# Altium schematic symbol library jlcpcb_2025_04_capacitors_extended_0402.schlib: 3594 symbols (part 3 of 20) (continued)
## 0402N4R3C500CT
designator C?  Capacitance: 4.3pF  (hidden comment: *)
Capacitor, Ceramic (MLCC), 4.3pF, 50V, NP0, SMD 0402; Manufacturer: Walsin Tech Corp; Manufacturer Part Number: 0402N4R3C500CT; Package Size: 0402; JLCPCB Basic Part: No; JLCPCB Part Number: C295987; Supplier 1: LCSC; Category: Capacitors - MLCC; Supplier Part Number 1: C295987; Voltage Rating: 50V; Temperature Coefficient: NP0; RoHS: Yes; ComponentLink1Description: Datasheet; ComponentLink1URL: https://wmsc.lcsc.com/wmsc/upload/file/pdf/v2/lcsc/2304140030_Walsin-Tech-Corp-0402N4R3C500CT_C295987.pdf; ComponentLink2Description: JLCPCB Part URL; ComponentLink2URL: https://jlcpcb.com/partdetail/C295987; ComponentLink3Description: LCSC Part URL; ComponentLink3URL: https://lcsc.com/product-detail/Multilayer-Ceramic-Capacitors-MLCC---SMD-SMT_Walsin-Tech-Corp-Walsin-Tech-Corp-0402N4R3C500CT_C295987.html
footprint CAP-0402 (0402 (1005M) Capacitor)
pins: 1, 2

## 0402N4R7B500CT
designator C?  Capacitance: 4.7pF  (hidden comment: *)
Capacitor, Ceramic (MLCC), 4.7pF, 50V, NP0, SMD 0402; Manufacturer: Walsin Tech Corp; Manufacturer Part Number: 0402N4R7B500CT; Package Size: 0402; JLCPCB Basic Part: No; JLCPCB Part Number: C295988; Supplier 1: LCSC; Category: Capacitors - MLCC; Supplier Part Number 1: C295988; Voltage Rating: 50V; Temperature Coefficient: NP0; RoHS: Yes; ComponentLink1Description: Datasheet; ComponentLink1URL: https://wmsc.lcsc.com/wmsc/upload/file/pdf/v2/lcsc/2304140030_Walsin-Tech-Corp-0402N4R7B500CT_C295988.pdf; ComponentLink2Description: JLCPCB Part URL; ComponentLink2URL: https://jlcpcb.com/partdetail/C295988; ComponentLink3Description: LCSC Part URL; ComponentLink3URL: https://lcsc.com/product-detail/Multilayer-Ceramic-Capacitors-MLCC---SMD-SMT_Walsin-Tech-Corp-Walsin-Tech-Corp-0402N4R7B500CT_C295988.html
footprint CAP-0402 (0402 (1005M) Capacitor)
pins: 1, 2

## 0402N4R7D500CT
designator C?  Capacitance: 4.7pF  (hidden comment: *)
Capacitor, Ceramic (MLCC), 4.7pF, 50V, NP0, SMD 0402; Manufacturer: Walsin Tech Corp; Manufacturer Part Number: 0402N4R7D500CT; Package Size: 0402; JLCPCB Basic Part: No; JLCPCB Part Number: C295990; Supplier 1: LCSC; Category: Capacitors - MLCC; Supplier Part Number 1: C295990; Voltage Rating: 50V; Temperature Coefficient: NP0; RoHS: Yes; ComponentLink1Description: Datasheet; ComponentLink1URL: https://wmsc.lcsc.com/wmsc/upload/file/pdf/v2/lcsc/2304140030_Walsin-Tech-Corp-0402N4R7D500CT_C295990.pdf; ComponentLink2Description: JLCPCB Part URL; ComponentLink2URL: https://jlcpcb.com/partdetail/C295990; ComponentLink3Description: LCSC Part URL; ComponentLink3URL: https://lcsc.com/product-detail/Multilayer-Ceramic-Capacitors-MLCC---SMD-SMT_Walsin-Tech-Corp-Walsin-Tech-Corp-0402N4R7D500CT_C295990.html
footprint CAP-0402 (0402 (1005M) Capacitor)
pins: 1, 2

## 0402N5R0B500CT
designator C?  Capacitance: 5pF  (hidden comment: *)
Capacitor, Ceramic (MLCC), 5pF, 50V, NP0, SMD 0402; Manufacturer: Walsin Tech Corp; Manufacturer Part Number: 0402N5R0B500CT; Package Size: 0402; JLCPCB Basic Part: No; JLCPCB Part Number: C458868; Supplier 1: LCSC; Category: Capacitors - MLCC; Supplier Part Number 1: C458868; Voltage Rating: 50V; Temperature Coefficient: NP0; RoHS: Yes; ComponentLink1Description: Datasheet; ComponentLink1URL: https://wmsc.lcsc.com/wmsc/upload/file/pdf/v2/lcsc/2304140030_Walsin-Tech-Corp-0402N5R0B500CT_C458868.pdf; ComponentLink2Description: JLCPCB Part URL; ComponentLink2URL: https://jlcpcb.com/partdetail/C458868; ComponentLink3Description: LCSC Part URL; ComponentLink3URL: https://lcsc.com/product-detail/Multilayer-Ceramic-Capacitors-MLCC---SMD-SMT_Walsin-Tech-Corp-Walsin-Tech-Corp-0402N5R0B500CT_C458868.html
footprint CAP-0402 (0402 (1005M) Capacitor)
pins: 1, 2

## 0402N5R0C500CT
designator C?  Capacitance: 5pF  (hidden comment: *)
Capacitor, Ceramic (MLCC), 5pF, 50V, NP0, SMD 0402; Manufacturer: Walsin Tech Corp; Manufacturer Part Number: 0402N5R0C500CT; Package Size: 0402; JLCPCB Basic Part: No; JLCPCB Part Number: C314281; Supplier 1: LCSC; Category: Capacitors - MLCC; Supplier Part Number 1: C314281; Voltage Rating: 50V; Temperature Coefficient: NP0; RoHS: Yes; ComponentLink1Description: Datasheet; ComponentLink1URL: https://wmsc.lcsc.com/wmsc/upload/file/pdf/v2/lcsc/2304140030_Walsin-Tech-Corp-0402N5R0C500CT_C314281.pdf; ComponentLink2Description: JLCPCB Part URL; ComponentLink2URL: https://jlcpcb.com/partdetail/C314281; ComponentLink3Description: LCSC Part URL; ComponentLink3URL: https://lcsc.com/product-detail/Multilayer-Ceramic-Capacitors-MLCC---SMD-SMT_Walsin-Tech-Corp-Walsin-Tech-Corp-0402N5R0C500CT_C314281.html
footprint CAP-0402 (0402 (1005M) Capacitor)
pins: 1, 2

## 0402N5R0D500CT
designator C?  Capacitance: 5pF  (hidden comment: *)
Capacitor, Ceramic (MLCC), 5pF, 50V, NP0, SMD 0402; Manufacturer: Walsin Tech Corp; Manufacturer Part Number: 0402N5R0D500CT; Package Size: 0402; JLCPCB Basic Part: No; JLCPCB Part Number: C295993; Supplier 1: LCSC; Category: Capacitors - MLCC; Supplier Part Number 1: C295993; Voltage Rating: 50V; Temperature Coefficient: NP0; RoHS: Yes; ComponentLink1Description: Datasheet; ComponentLink1URL: https://wmsc.lcsc.com/wmsc/upload/file/pdf/v2/lcsc/2304140030_Walsin-Tech-Corp-0402N5R0D500CT_C295993.pdf; ComponentLink2Description: JLCPCB Part URL; ComponentLink2URL: https://jlcpcb.com/partdetail/C295993; ComponentLink3Description: LCSC Part URL; ComponentLink3URL: https://lcsc.com/product-detail/Multilayer-Ceramic-Capacitors-MLCC---SMD-SMT_Walsin-Tech-Corp-Walsin-Tech-Corp-0402N5R0D500CT_C295993.html
footprint CAP-0402 (0402 (1005M) Capacitor)
pins: 1, 2

## 0402N5R6C500CT
designator C?  Capacitance: 5.6pF  (hidden comment: *)
Capacitor, Ceramic (MLCC), 5.6pF, 50V, NP0, SMD 0402; Manufacturer: Walsin Tech Corp; Manufacturer Part Number: 0402N5R6C500CT; Package Size: 0402; JLCPCB Basic Part: No; JLCPCB Part Number: C387981; Supplier 1: LCSC; Category: Capacitors - MLCC; Supplier Part Number 1: C387981; Voltage Rating: 50V; Temperature Coefficient: NP0; RoHS: Yes; ComponentLink1Description: Datasheet; ComponentLink1URL: https://wmsc.lcsc.com/wmsc/upload/file/pdf/v2/lcsc/2304140030_Walsin-Tech-Corp-0402N5R6C500CT_C387981.pdf; ComponentLink2Description: JLCPCB Part URL; ComponentLink2URL: https://jlcpcb.com/partdetail/C387981; ComponentLink3Description: LCSC Part URL; ComponentLink3URL: https://lcsc.com/product-detail/Multilayer-Ceramic-Capacitors-MLCC---SMD-SMT_Walsin-Tech-Corp-Walsin-Tech-Corp-0402N5R6C500CT_C387981.html
footprint CAP-0402 (0402 (1005M) Capacitor)
pins: 1, 2

## 0402N5R6D500CT
designator C?  Capacitance: 5.6pF  (hidden comment: *)
Capacitor, Ceramic (MLCC), 5.6pF, 50V, NP0, SMD 0402; Manufacturer: Walsin Tech Corp; Manufacturer Part Number: 0402N5R6D500CT; Package Size: 0402; JLCPCB Basic Part: No; JLCPCB Part Number: C525498; Supplier 1: LCSC; Category: Capacitors - MLCC; Supplier Part Number 1: C525498; Voltage Rating: 50V; Temperature Coefficient: NP0; RoHS: Yes; ComponentLink1Description: Datasheet; ComponentLink1URL: https://wmsc.lcsc.com/wmsc/upload/file/pdf/v2/lcsc/2304140030_Walsin-Tech-Corp-0402N5R6D500CT_C525498.pdf; ComponentLink2Description: JLCPCB Part URL; ComponentLink2URL: https://jlcpcb.com/partdetail/C525498; ComponentLink3Description: LCSC Part URL; ComponentLink3URL: https://lcsc.com/product-detail/Multilayer-Ceramic-Capacitors-MLCC---SMD-SMT_Walsin-Tech-Corp-Walsin-Tech-Corp-0402N5R6D500CT_C525498.html
footprint CAP-0402 (0402 (1005M) Capacitor)
pins: 1, 2

## 0402N6R0C500CT
designator C?  Capacitance: 6pF  (hidden comment: *)
Capacitor, Ceramic (MLCC), 6pF, 50V, NP0, SMD 0402; Manufacturer: Walsin Tech Corp; Manufacturer Part Number: 0402N6R0C500CT; Package Size: 0402; JLCPCB Basic Part: No; JLCPCB Part Number: C555384; Supplier 1: LCSC; Category: Capacitors - MLCC; Supplier Part Number 1: C555384; Voltage Rating: 50V; Temperature Coefficient: NP0; RoHS: Yes; ComponentLink1Description: Datasheet; ComponentLink1URL: https://wmsc.lcsc.com/wmsc/upload/file/pdf/v2/lcsc/2304140030_Walsin-Tech-Corp-0402N6R0C500CT_C555384.pdf; ComponentLink2Description: JLCPCB Part URL; ComponentLink2URL: https://jlcpcb.com/partdetail/C555384; ComponentLink3Description: LCSC Part URL; ComponentLink3URL: https://lcsc.com/product-detail/Multilayer-Ceramic-Capacitors-MLCC---SMD-SMT_Walsin-Tech-Corp-Walsin-Tech-Corp-0402N6R0C500CT_C555384.html
footprint CAP-0402 (0402 (1005M) Capacitor)
pins: 1, 2

## 0402N6R0D500CT
designator C?  Capacitance: 6pF  (hidden comment: *)
Capacitor, Ceramic (MLCC), 6pF, 50V, NP0, SMD 0402; Manufacturer: Walsin Tech Corp; Manufacturer Part Number: 0402N6R0D500CT; Package Size: 0402; JLCPCB Basic Part: No; JLCPCB Part Number: C295997; Supplier 1: LCSC; Category: Capacitors - MLCC; Supplier Part Number 1: C295997; Voltage Rating: 50V; Temperature Coefficient: NP0; RoHS: Yes; ComponentLink1Description: Datasheet; ComponentLink1URL: https://wmsc.lcsc.com/wmsc/upload/file/pdf/v2/lcsc/2304140030_Walsin-Tech-Corp-0402N6R0D500CT_C295997.pdf; ComponentLink2Description: JLCPCB Part URL; ComponentLink2URL: https://jlcpcb.com/partdetail/C295997; ComponentLink3Description: LCSC Part URL; ComponentLink3URL: https://lcsc.com/product-detail/Multilayer-Ceramic-Capacitors-MLCC---SMD-SMT_Walsin-Tech-Corp-Walsin-Tech-Corp-0402N6R0D500CT_C295997.html
footprint CAP-0402 (0402 (1005M) Capacitor)
pins: 1, 2

## 0402N6R2D500CT
designator C?  Capacitance: 6.2pF  (hidden comment: *)
Capacitor, Ceramic (MLCC), 6.2pF, 50V, NP0, SMD 0402; Manufacturer: Walsin Tech Corp; Manufacturer Part Number: 0402N6R2D500CT; Package Size: 0402; JLCPCB Basic Part: No; JLCPCB Part Number: C295998; Supplier 1: LCSC; Category: Capacitors - MLCC; Supplier Part Number 1: C295998; Voltage Rating: 50V; Temperature Coefficient: NP0; RoHS: Yes; ComponentLink1Description: Datasheet; ComponentLink1URL: https://wmsc.lcsc.com/wmsc/upload/file/pdf/v2/lcsc/2304140030_Walsin-Tech-Corp-0402N6R2D500CT_C295998.pdf; ComponentLink2Description: JLCPCB Part URL; ComponentLink2URL: https://jlcpcb.com/partdetail/C295998; ComponentLink3Description: LCSC Part URL; ComponentLink3URL: https://lcsc.com/product-detail/Multilayer-Ceramic-Capacitors-MLCC---SMD-SMT_Walsin-Tech-Corp-Walsin-Tech-Corp-0402N6R2D500CT_C295998.html
footprint CAP-0402 (0402 (1005M) Capacitor)
pins: 1, 2

## 0402N6R8B500CT
designator C?  Capacitance: 6.8pF  (hidden comment: *)
Capacitor, Ceramic (MLCC), 6.8pF, 50V, NP0, SMD 0402; Manufacturer: Walsin Tech Corp; Manufacturer Part Number: 0402N6R8B500CT; Package Size: 0402; JLCPCB Basic Part: No; JLCPCB Part Number: C295999; Supplier 1: LCSC; Category: Capacitors - MLCC; Supplier Part Number 1: C295999; Voltage Rating: 50V; Temperature Coefficient: NP0; RoHS: Yes; ComponentLink1Description: Datasheet; ComponentLink1URL: https://wmsc.lcsc.com/wmsc/upload/file/pdf/v2/lcsc/2304140030_Walsin-Tech-Corp-0402N6R8B500CT_C295999.pdf; ComponentLink2Description: JLCPCB Part URL; ComponentLink2URL: https://jlcpcb.com/partdetail/C295999; ComponentLink3Description: LCSC Part URL; ComponentLink3URL: https://lcsc.com/product-detail/Multilayer-Ceramic-Capacitors-MLCC---SMD-SMT_Walsin-Tech-Corp-Walsin-Tech-Corp-0402N6R8B500CT_C295999.html
footprint CAP-0402 (0402 (1005M) Capacitor)
pins: 1, 2

## 0402N6R8C500CT
designator C?  Capacitance: 6.8pF  (hidden comment: *)
Capacitor, Ceramic (MLCC), 6.8pF, 50V, NP0, SMD 0402; Manufacturer: Walsin Tech Corp; Manufacturer Part Number: 0402N6R8C500CT; Package Size: 0402; JLCPCB Basic Part: No; JLCPCB Part Number: C296000; Supplier 1: LCSC; Category: Capacitors - MLCC; Supplier Part Number 1: C296000; Voltage Rating: 50V; Temperature Coefficient: NP0; RoHS: Yes; ComponentLink1Description: Datasheet; ComponentLink1URL: https://wmsc.lcsc.com/wmsc/upload/file/pdf/v2/lcsc/2304140030_Walsin-Tech-Corp-0402N6R8C500CT_C296000.pdf; ComponentLink2Description: JLCPCB Part URL; ComponentLink2URL: https://jlcpcb.com/partdetail/C296000; ComponentLink3Description: LCSC Part URL; ComponentLink3URL: https://lcsc.com/product-detail/Multilayer-Ceramic-Capacitors-MLCC---SMD-SMT_Walsin-Tech-Corp-Walsin-Tech-Corp-0402N6R8C500CT_C296000.html
footprint CAP-0402 (0402 (1005M) Capacitor)
pins: 1, 2

## 0402N7R0B500CT
designator C?  Capacitance: 7pF  (hidden comment: *)
Capacitor, Ceramic (MLCC), 7pF, 50V, NP0, SMD 0402; Manufacturer: Walsin Tech Corp; Manufacturer Part Number: 0402N7R0B500CT; Package Size: 0402; JLCPCB Basic Part: No; JLCPCB Part Number: C366878; Supplier 1: LCSC; Category: Capacitors - MLCC; Supplier Part Number 1: C366878; Voltage Rating: 50V; Temperature Coefficient: NP0; RoHS: Yes; ComponentLink1Description: Datasheet; ComponentLink1URL: https://wmsc.lcsc.com/wmsc/upload/file/pdf/v2/lcsc/2304140030_Walsin-Tech-Corp-0402N7R0B500CT_C366878.pdf; ComponentLink2Description: JLCPCB Part URL; ComponentLink2URL: https://jlcpcb.com/partdetail/C366878; ComponentLink3Description: LCSC Part URL; ComponentLink3URL: https://lcsc.com/product-detail/Multilayer-Ceramic-Capacitors-MLCC---SMD-SMT_Walsin-Tech-Corp-Walsin-Tech-Corp-0402N7R0B500CT_C366878.html
footprint CAP-0402 (0402 (1005M) Capacitor)
pins: 1, 2

## 0402N7R0C500CT
designator C?  Capacitance: 7pF  (hidden comment: *)
Capacitor, Ceramic (MLCC), 7pF, 50V, NP0, SMD 0402; Manufacturer: Walsin Tech Corp; Manufacturer Part Number: 0402N7R0C500CT; Package Size: 0402; JLCPCB Basic Part: No; JLCPCB Part Number: C296001; Supplier 1: LCSC; Category: Capacitors - MLCC; Supplier Part Number 1: C296001; Voltage Rating: 50V; Temperature Coefficient: NP0; RoHS: Yes; ComponentLink1Description: Datasheet; ComponentLink1URL: https://wmsc.lcsc.com/wmsc/upload/file/pdf/v2/lcsc/2304140030_Walsin-Tech-Corp-0402N7R0C500CT_C296001.pdf; ComponentLink2Description: JLCPCB Part URL; ComponentLink2URL: https://jlcpcb.com/partdetail/C296001; ComponentLink3Description: LCSC Part URL; ComponentLink3URL: https://lcsc.com/product-detail/Multilayer-Ceramic-Capacitors-MLCC---SMD-SMT_Walsin-Tech-Corp-Walsin-Tech-Corp-0402N7R0C500CT_C296001.html
footprint CAP-0402 (0402 (1005M) Capacitor)
pins: 1, 2

## 0402N7R0C500CT-C
designator C?  Capacitance: 7pF  (hidden comment: *)
Capacitor, Ceramic (MLCC), 7pF, 50V, NP0, SMD 0402; Manufacturer: Walsin Tech Corp; Manufacturer Part Number: 0402N7R0C500CT-C; Package Size: 0402; JLCPCB Basic Part: No; JLCPCB Part Number: C2991471; Supplier 1: LCSC; Category: Capacitors - MLCC; Supplier Part Number 1: C2991471; Voltage Rating: 50V; Temperature Coefficient: NP0; RoHS: Yes; ComponentLink1Description: Datasheet; ComponentLink1URL: https://wmsc.lcsc.com/wmsc/upload/file/pdf/v2/lcsc/2204131745_Walsin-Tech-Corp-0402N7R0C500CT-C_C2991471.pdf; ComponentLink2Description: JLCPCB Part URL; ComponentLink2URL: https://jlcpcb.com/partdetail/C2991471; ComponentLink3Description: LCSC Part URL; ComponentLink3URL: https://lcsc.com/product-detail/Multilayer-Ceramic-Capacitors-MLCC---SMD-SMT_Walsin-Tech-Corp-Walsin-Tech-Corp-0402N7R0C500CT-C_C2991471.html
footprint CAP-0402 (0402 (1005M) Capacitor)
pins: 1, 2

## 0402N7R0D500CT
designator C?  Capacitance: 7pF  (hidden comment: *)
Capacitor, Ceramic (MLCC), 7pF, 50V, NP0, SMD 0402; Manufacturer: Walsin Tech Corp; Manufacturer Part Number: 0402N7R0D500CT; Package Size: 0402; JLCPCB Basic Part: No; JLCPCB Part Number: C314299; Supplier 1: LCSC; Category: Capacitors - MLCC; Supplier Part Number 1: C314299; Voltage Rating: 50V; Temperature Coefficient: NP0; RoHS: Yes; ComponentLink1Description: Datasheet; ComponentLink1URL: https://wmsc.lcsc.com/wmsc/upload/file/pdf/v2/lcsc/2304140030_Walsin-Tech-Corp-0402N7R0D500CT_C314299.pdf; ComponentLink2Description: JLCPCB Part URL; ComponentLink2URL: https://jlcpcb.com/partdetail/C314299; ComponentLink3Description: LCSC Part URL; ComponentLink3URL: https://lcsc.com/product-detail/Multilayer-Ceramic-Capacitors-MLCC---SMD-SMT_Walsin-Tech-Corp-Walsin-Tech-Corp-0402N7R0D500CT_C314299.html
footprint CAP-0402 (0402 (1005M) Capacitor)
pins: 1, 2

## 0402N7R5C500CT
designator C?  Capacitance: 7.5pF  (hidden comment: *)
Capacitor, Ceramic (MLCC), 7.5pF, 50V, NP0, SMD 0402; Manufacturer: Walsin Tech Corp; Manufacturer Part Number: 0402N7R5C500CT; Package Size: 0402; JLCPCB Basic Part: No; JLCPCB Part Number: C296002; Supplier 1: LCSC; Category: Capacitors - MLCC; Supplier Part Number 1: C296002; Voltage Rating: 50V; Temperature Coefficient: NP0; RoHS: Yes; ComponentLink1Description: Datasheet; ComponentLink1URL: https://wmsc.lcsc.com/wmsc/upload/file/pdf/v2/lcsc/2304140030_Walsin-Tech-Corp-0402N7R5C500CT_C296002.pdf; ComponentLink2Description: JLCPCB Part URL; ComponentLink2URL: https://jlcpcb.com/partdetail/C296002; ComponentLink3Description: LCSC Part URL; ComponentLink3URL: https://lcsc.com/product-detail/Multilayer-Ceramic-Capacitors-MLCC---SMD-SMT_Walsin-Tech-Corp-Walsin-Tech-Corp-0402N7R5C500CT_C296002.html
footprint CAP-0402 (0402 (1005M) Capacitor)
pins: 1, 2

## 0402N7R5D500CT
designator C?  Capacitance: 7.5pF  (hidden comment: *)
Capacitor, Ceramic (MLCC), 7.5pF, 50V, NP0, SMD 0402; Manufacturer: Walsin Tech Corp; Manufacturer Part Number: 0402N7R5D500CT; Package Size: 0402; JLCPCB Basic Part: No; JLCPCB Part Number: C388119; Supplier 1: LCSC; Category: Capacitors - MLCC; Supplier Part Number 1: C388119; Voltage Rating: 50V; Temperature Coefficient: NP0; RoHS: Yes; ComponentLink1Description: Datasheet; ComponentLink1URL: https://wmsc.lcsc.com/wmsc/upload/file/pdf/v2/lcsc/2304140030_Walsin-Tech-Corp-0402N7R5D500CT_C388119.pdf; ComponentLink2Description: JLCPCB Part URL; ComponentLink2URL: https://jlcpcb.com/partdetail/C388119; ComponentLink3Description: LCSC Part URL; ComponentLink3URL: https://lcsc.com/product-detail/Multilayer-Ceramic-Capacitors-MLCC---SMD-SMT_Walsin-Tech-Corp-Walsin-Tech-Corp-0402N7R5D500CT_C388119.html
footprint CAP-0402 (0402 (1005M) Capacitor)
pins: 1, 2

## 0402N8R0B500CT
designator C?  Capacitance: 8pF  (hidden comment: *)
Capacitor, Ceramic (MLCC), 8pF, 50V, NP0, SMD 0402; Manufacturer: Walsin Tech Corp; Manufacturer Part Number: 0402N8R0B500CT; Package Size: 0402; JLCPCB Basic Part: No; JLCPCB Part Number: C314292; Supplier 1: LCSC; Category: Capacitors - MLCC; Supplier Part Number 1: C314292; Voltage Rating: 50V; Temperature Coefficient: NP0; RoHS: Yes; ComponentLink1Description: Datasheet; ComponentLink1URL: https://wmsc.lcsc.com/wmsc/upload/file/pdf/v2/lcsc/2304140030_Walsin-Tech-Corp-0402N8R0B500CT_C314292.pdf; ComponentLink2Description: JLCPCB Part URL; ComponentLink2URL: https://jlcpcb.com/partdetail/C314292; ComponentLink3Description: LCSC Part URL; ComponentLink3URL: https://lcsc.com/product-detail/Multilayer-Ceramic-Capacitors-MLCC---SMD-SMT_Walsin-Tech-Corp-Walsin-Tech-Corp-0402N8R0B500CT_C314292.html
footprint CAP-0402 (0402 (1005M) Capacitor)
pins: 1, 2

## 0402N8R0C500CT
designator C?  Capacitance: 8pF  (hidden comment: *)
Capacitor, Ceramic (MLCC), 8pF, 50V, NP0, SMD 0402; Manufacturer: Walsin Tech Corp; Manufacturer Part Number: 0402N8R0C500CT; Package Size: 0402; JLCPCB Basic Part: No; JLCPCB Part Number: C296005; Supplier 1: LCSC; Category: Capacitors - MLCC; Supplier Part Number 1: C296005; Voltage Rating: 50V; Temperature Coefficient: NP0; RoHS: Yes; ComponentLink1Description: Datasheet; ComponentLink1URL: https://wmsc.lcsc.com/wmsc/upload/file/pdf/v2/lcsc/2304140030_Walsin-Tech-Corp-0402N8R0C500CT_C296005.pdf; ComponentLink2Description: JLCPCB Part URL; ComponentLink2URL: https://jlcpcb.com/partdetail/C296005; ComponentLink3Description: LCSC Part URL; ComponentLink3URL: https://lcsc.com/product-detail/Multilayer-Ceramic-Capacitors-MLCC---SMD-SMT_Walsin-Tech-Corp-Walsin-Tech-Corp-0402N8R0C500CT_C296005.html
footprint CAP-0402 (0402 (1005M) Capacitor)
pins: 1, 2

## 0402N8R0D500CT
designator C?  Capacitance: 8pF  (hidden comment: *)
Capacitor, Ceramic (MLCC), 8pF, 50V, NP0, SMD 0402; Manufacturer: Walsin Tech Corp; Manufacturer Part Number: 0402N8R0D500CT; Package Size: 0402; JLCPCB Basic Part: No; JLCPCB Part Number: C296006; Supplier 1: LCSC; Category: Capacitors - MLCC; Supplier Part Number 1: C296006; Voltage Rating: 50V; Temperature Coefficient: NP0; RoHS: Yes; ComponentLink1Description: Datasheet; ComponentLink1URL: https://wmsc.lcsc.com/wmsc/upload/file/pdf/v2/lcsc/2304140030_Walsin-Tech-Corp-0402N8R0D500CT_C296006.pdf; ComponentLink2Description: JLCPCB Part URL; ComponentLink2URL: https://jlcpcb.com/partdetail/C296006; ComponentLink3Description: LCSC Part URL; ComponentLink3URL: https://lcsc.com/product-detail/Multilayer-Ceramic-Capacitors-MLCC---SMD-SMT_Walsin-Tech-Corp-Walsin-Tech-Corp-0402N8R0D500CT_C296006.html
footprint CAP-0402 (0402 (1005M) Capacitor)
pins: 1, 2

## 0402N8R2B500CT
designator C?  Capacitance: 8.2pF  (hidden comment: *)
Capacitor, Ceramic (MLCC), 8.2pF, 50V, NP0, SMD 0402; Manufacturer: Walsin Tech Corp; Manufacturer Part Number: 0402N8R2B500CT; Package Size: 0402; JLCPCB Basic Part: No; JLCPCB Part Number: C301994; Supplier 1: LCSC; Category: Capacitors - MLCC; Supplier Part Number 1: C301994; Voltage Rating: 50V; Temperature Coefficient: NP0; RoHS: Yes; ComponentLink1Description: Datasheet; ComponentLink1URL: https://wmsc.lcsc.com/wmsc/upload/file/pdf/v2/lcsc/2304140030_Walsin-Tech-Corp-0402N8R2B500CT_C301994.pdf; ComponentLink2Description: JLCPCB Part URL; ComponentLink2URL: https://jlcpcb.com/partdetail/C301994; ComponentLink3Description: LCSC Part URL; ComponentLink3URL: https://lcsc.com/product-detail/Multilayer-Ceramic-Capacitors-MLCC---SMD-SMT_Walsin-Tech-Corp-Walsin-Tech-Corp-0402N8R2B500CT_C301994.html
footprint CAP-0402 (0402 (1005M) Capacitor)
pins: 1, 2

## 0402N8R2C500CT
designator C?  Capacitance: 8.2pF  (hidden comment: *)
Capacitor, Ceramic (MLCC), 8.2pF, 50V, NP0, SMD 0402; Manufacturer: Walsin Tech Corp; Manufacturer Part Number: 0402N8R2C500CT; Package Size: 0402; JLCPCB Basic Part: No; JLCPCB Part Number: C296007; Supplier 1: LCSC; Category: Capacitors - MLCC; Supplier Part Number 1: C296007; Voltage Rating: 50V; Temperature Coefficient: NP0; RoHS: Yes; ComponentLink1Description: Datasheet; ComponentLink1URL: https://wmsc.lcsc.com/wmsc/upload/file/pdf/v2/lcsc/2304140030_Walsin-Tech-Corp-0402N8R2C500CT_C296007.pdf; ComponentLink2Description: JLCPCB Part URL; ComponentLink2URL: https://jlcpcb.com/partdetail/C296007; ComponentLink3Description: LCSC Part URL; ComponentLink3URL: https://lcsc.com/product-detail/Multilayer-Ceramic-Capacitors-MLCC---SMD-SMT_Walsin-Tech-Corp-Walsin-Tech-Corp-0402N8R2C500CT_C296007.html
footprint CAP-0402 (0402 (1005M) Capacitor)
pins: 1, 2

## 0402N8R2C500CT-C
designator C?  Capacitance: 8.2pF  (hidden comment: *)
Capacitor, Ceramic (MLCC), 8.2pF, 50V, NP0, SMD 0402; Manufacturer: Walsin Tech Corp; Manufacturer Part Number: 0402N8R2C500CT-C; Package Size: 0402; JLCPCB Basic Part: No; JLCPCB Part Number: C2991485; Supplier 1: LCSC; Category: Capacitors - MLCC; Supplier Part Number 1: C2991485; Voltage Rating: 50V; Temperature Coefficient: NP0; RoHS: Yes; ComponentLink1Description: Datasheet; ComponentLink1URL: https://wmsc.lcsc.com/wmsc/upload/file/pdf/v2/lcsc/2204131745_Walsin-Tech-Corp-0402N8R2C500CT-C_C2991485.pdf; ComponentLink2Description: JLCPCB Part URL; ComponentLink2URL: https://jlcpcb.com/partdetail/C2991485; ComponentLink3Description: LCSC Part URL; ComponentLink3URL: https://lcsc.com/product-detail/Multilayer-Ceramic-Capacitors-MLCC---SMD-SMT_Walsin-Tech-Corp-Walsin-Tech-Corp-0402N8R2C500CT-C_C2991485.html
footprint CAP-0402 (0402 (1005M) Capacitor)
pins: 1, 2

## 0402N8R2D500CT
designator C?  Capacitance: 8.2pF  (hidden comment: *)
Capacitor, Ceramic (MLCC), 8.2pF, 50V, NP0, SMD 0402; Manufacturer: Walsin Tech Corp; Manufacturer Part Number: 0402N8R2D500CT; Package Size: 0402; JLCPCB Basic Part: No; JLCPCB Part Number: C301995; Supplier 1: LCSC; Category: Capacitors - MLCC; Supplier Part Number 1: C301995; Voltage Rating: 50V; Temperature Coefficient: NP0; RoHS: Yes; ComponentLink1Description: Datasheet; ComponentLink1URL: https://wmsc.lcsc.com/wmsc/upload/file/pdf/v2/lcsc/2304140030_Walsin-Tech-Corp-0402N8R2D500CT_C301995.pdf; ComponentLink2Description: JLCPCB Part URL; ComponentLink2URL: https://jlcpcb.com/partdetail/C301995; ComponentLink3Description: LCSC Part URL; ComponentLink3URL: https://lcsc.com/product-detail/Multilayer-Ceramic-Capacitors-MLCC---SMD-SMT_Walsin-Tech-Corp-Walsin-Tech-Corp-0402N8R2D500CT_C301995.html
footprint CAP-0402 (0402 (1005M) Capacitor)
pins: 1, 2

## 0402N9R0B500CT
designator C?  Capacitance: 9pF  (hidden comment: *)
Capacitor, Ceramic (MLCC), 9pF, 50V, NP0, SMD 0402; Manufacturer: Walsin Tech Corp; Manufacturer Part Number: 0402N9R0B500CT; Package Size: 0402; JLCPCB Basic Part: No; JLCPCB Part Number: C384797; Supplier 1: LCSC; Category: Capacitors - MLCC; Supplier Part Number 1: C384797; Voltage Rating: 50V; Temperature Coefficient: NP0; RoHS: Yes; ComponentLink1Description: Datasheet; ComponentLink1URL: https://wmsc.lcsc.com/wmsc/upload/file/pdf/v2/lcsc/2304140030_Walsin-Tech-Corp-0402N9R0B500CT_C384797.pdf; ComponentLink2Description: JLCPCB Part URL; ComponentLink2URL: https://jlcpcb.com/partdetail/C384797; ComponentLink3Description: LCSC Part URL; ComponentLink3URL: https://lcsc.com/product-detail/Multilayer-Ceramic-Capacitors-MLCC---SMD-SMT_Walsin-Tech-Corp-Walsin-Tech-Corp-0402N9R0B500CT_C384797.html
footprint CAP-0402 (0402 (1005M) Capacitor)
pins: 1, 2

## 0402N9R0C500CT
designator C?  Capacitance: 9pF  (hidden comment: *)
Capacitor, Ceramic (MLCC), 9pF, 50V, NP0, SMD 0402; Manufacturer: Walsin Tech Corp; Manufacturer Part Number: 0402N9R0C500CT; Package Size: 0402; JLCPCB Basic Part: No; JLCPCB Part Number: C296009; Supplier 1: LCSC; Category: Capacitors - MLCC; Supplier Part Number 1: C296009; Voltage Rating: 50V; Temperature Coefficient: NP0; RoHS: Yes; ComponentLink1Description: Datasheet; ComponentLink1URL: https://wmsc.lcsc.com/wmsc/upload/file/pdf/v2/lcsc/2304140030_Walsin-Tech-Corp-0402N9R0C500CT_C296009.pdf; ComponentLink2Description: JLCPCB Part URL; ComponentLink2URL: https://jlcpcb.com/partdetail/C296009; ComponentLink3Description: LCSC Part URL; ComponentLink3URL: https://lcsc.com/product-detail/Multilayer-Ceramic-Capacitors-MLCC---SMD-SMT_Walsin-Tech-Corp-Walsin-Tech-Corp-0402N9R0C500CT_C296009.html
footprint CAP-0402 (0402 (1005M) Capacitor)
pins: 1, 2

## 0402N9R0D500CT
designator C?  Capacitance: 9pF  (hidden comment: *)
Capacitor, Ceramic (MLCC), 9pF, 50V, NP0, SMD 0402; Manufacturer: Walsin Tech Corp; Manufacturer Part Number: 0402N9R0D500CT; Package Size: 0402; JLCPCB Basic Part: No; JLCPCB Part Number: C296010; Supplier 1: LCSC; Category: Capacitors - MLCC; Supplier Part Number 1: C296010; Voltage Rating: 50V; Temperature Coefficient: NP0; RoHS: Yes; ComponentLink1Description: Datasheet; ComponentLink1URL: https://wmsc.lcsc.com/wmsc/upload/file/pdf/v2/lcsc/2304140030_Walsin-Tech-Corp-0402N9R0D500CT_C296010.pdf; ComponentLink2Description: JLCPCB Part URL; ComponentLink2URL: https://jlcpcb.com/partdetail/C296010; ComponentLink3Description: LCSC Part URL; ComponentLink3URL: https://lcsc.com/product-detail/Multilayer-Ceramic-Capacitors-MLCC---SMD-SMT_Walsin-Tech-Corp-Walsin-Tech-Corp-0402N9R0D500CT_C296010.html
footprint CAP-0402 (0402 (1005M) Capacitor)
pins: 1, 2

## 0402N9R1C500CT
designator C?  Capacitance: 9.1pF  (hidden comment: *)
Capacitor, Ceramic (MLCC), 9.1pF, 50V, NP0, SMD 0402; Manufacturer: Walsin Tech Corp; Manufacturer Part Number: 0402N9R1C500CT; Package Size: 0402; JLCPCB Basic Part: No; JLCPCB Part Number: C2875524; Supplier 1: LCSC; Category: Capacitors - MLCC; Supplier Part Number 1: C2875524; Voltage Rating: 50V; Temperature Coefficient: NP0; RoHS: Yes; ComponentLink1Description: Datasheet; ComponentLink1URL: https://wmsc.lcsc.com/wmsc/upload/file/pdf/v2/lcsc/2108241230_Walsin-Tech-Corp-0402N9R1C500CT_C2875524.pdf; ComponentLink2Description: JLCPCB Part URL; ComponentLink2URL: https://jlcpcb.com/partdetail/C2875524; ComponentLink3Description: LCSC Part URL; ComponentLink3URL: https://lcsc.com/product-detail/Multilayer-Ceramic-Capacitors-MLCC---SMD-SMT_Walsin-Tech-Corp-Walsin-Tech-Corp-0402N9R1C500CT_C2875524.html
footprint CAP-0402 (0402 (1005M) Capacitor)
pins: 1, 2

## 0402N100C500CT
designator C?  Capacitance: 10pF  (hidden comment: *)
Capacitor, Ceramic (MLCC), 10pF, 50V, NP0, SMD 0402; Manufacturer: Walsin Tech Corp; Manufacturer Part Number: 0402N100C500CT; Package Size: 0402; JLCPCB Basic Part: No; JLCPCB Part Number: C387966; Supplier 1: LCSC; Category: Capacitors - MLCC; Supplier Part Number 1: C387966; Voltage Rating: 50V; Temperature Coefficient: NP0; RoHS: Yes; ComponentLink1Description: Datasheet; ComponentLink1URL: https://wmsc.lcsc.com/wmsc/upload/file/pdf/v2/lcsc/2304140030_Walsin-Tech-Corp-0402N100C500CT_C387966.pdf; ComponentLink2Description: JLCPCB Part URL; ComponentLink2URL: https://jlcpcb.com/partdetail/C387966; ComponentLink3Description: LCSC Part URL; ComponentLink3URL: https://lcsc.com/product-detail/Multilayer-Ceramic-Capacitors-MLCC---SMD-SMT_Walsin-Tech-Corp-Walsin-Tech-Corp-0402N100C500CT_C387966.html
footprint CAP-0402 (0402 (1005M) Capacitor)
pins: 1, 2

## 0402N100D500CT
designator C?  Capacitance: 10pF  (hidden comment: *)
Capacitor, Ceramic (MLCC), 10pF, 50V, NP0, SMD 0402; Manufacturer: Walsin Tech Corp; Manufacturer Part Number: 0402N100D500CT; Package Size: 0402; JLCPCB Basic Part: No; JLCPCB Part Number: C295953; Supplier 1: LCSC; Category: Capacitors - MLCC; Supplier Part Number 1: C295953; Voltage Rating: 50V; Temperature Coefficient: NP0; RoHS: Yes; ComponentLink1Description: Datasheet; ComponentLink1URL: https://wmsc.lcsc.com/wmsc/upload/file/pdf/v2/lcsc/2304140030_Walsin-Tech-Corp-0402N100D500CT_C295953.pdf; ComponentLink2Description: JLCPCB Part URL; ComponentLink2URL: https://jlcpcb.com/partdetail/C295953; ComponentLink3Description: LCSC Part URL; ComponentLink3URL: https://lcsc.com/product-detail/Multilayer-Ceramic-Capacitors-MLCC---SMD-SMT_Walsin-Tech-Corp-Walsin-Tech-Corp-0402N100D500CT_C295953.html
footprint CAP-0402 (0402 (1005M) Capacitor)
pins: 1, 2

## 0402N100F500CT
designator C?  Capacitance: 10pF  (hidden comment: *)
Capacitor, Ceramic (MLCC), 10pF, ±1%, 50V, NP0, ±1%, SMD 0402; Manufacturer: Walsin Tech Corp; Manufacturer Part Number: 0402N100F500CT; Package Size: 0402; JLCPCB Basic Part: No; JLCPCB Part Number: C237160; Supplier 1: LCSC; Category: Capacitors - MLCC; Supplier Part Number 1: C237160; Tolerance: ±1%; Voltage Rating: 50V; Temperature Coefficient: NP0; RoHS: Yes; ComponentLink1Description: Datasheet; ComponentLink1URL: https://wmsc.lcsc.com/wmsc/upload/file/pdf/v2/lcsc/2304140030_Walsin-Tech-Corp-0402N100F500CT_C237160.pdf; ComponentLink2Description: JLCPCB Part URL; ComponentLink2URL: https://jlcpcb.com/partdetail/C237160; ComponentLink3Description: LCSC Part URL; ComponentLink3URL: https://lcsc.com/product-detail/Multilayer-Ceramic-Capacitors-MLCC---SMD-SMT_Walsin-Tech-Corp-Walsin-Tech-Corp-0402N100F500CT_C237160.html
footprint CAP-0402 (0402 (1005M) Capacitor)
pins: 1, 2

## 0402N100G500CT
designator C?  Capacitance: 10pF  (hidden comment: *)
Capacitor, Ceramic (MLCC), 10pF, ±2%, 50V, NP0, ±2%, SMD 0402; Manufacturer: Walsin Tech Corp; Manufacturer Part Number: 0402N100G500CT; Package Size: 0402; JLCPCB Basic Part: No; JLCPCB Part Number: C338152; Supplier 1: LCSC; Category: Capacitors - MLCC; Supplier Part Number 1: C338152; Tolerance: ±2%; Voltage Rating: 50V; Temperature Coefficient: NP0; RoHS: Yes; ComponentLink1Description: Datasheet; ComponentLink1URL: https://wmsc.lcsc.com/wmsc/upload/file/pdf/v2/lcsc/2304140030_Walsin-Tech-Corp-0402N100G500CT_C338152.pdf; ComponentLink2Description: JLCPCB Part URL; ComponentLink2URL: https://jlcpcb.com/partdetail/C338152; ComponentLink3Description: LCSC Part URL; ComponentLink3URL: https://lcsc.com/product-detail/Multilayer-Ceramic-Capacitors-MLCC---SMD-SMT_Walsin-Tech-Corp-Walsin-Tech-Corp-0402N100G500CT_C338152.html
footprint CAP-0402 (0402 (1005M) Capacitor)
pins: 1, 2

## 0402N100J250CT
designator C?  Capacitance: 10pF  (hidden comment: *)
Capacitor, Ceramic (MLCC), 10pF, ±5%, 25V, NP0, ±5%, SMD 0402; Manufacturer: Walsin Tech Corp; Manufacturer Part Number: 0402N100J250CT; Package Size: 0402; JLCPCB Basic Part: No; JLCPCB Part Number: C424825; Supplier 1: LCSC; Category: Capacitors - MLCC; Supplier Part Number 1: C424825; Tolerance: ±5%; Voltage Rating: 25V; Temperature Coefficient: NP0; RoHS: Yes; ComponentLink1Description: Datasheet; ComponentLink1URL: https://wmsc.lcsc.com/wmsc/upload/file/pdf/v2/lcsc/2304140030_Walsin-Tech-Corp-0402N100J250CT_C424825.pdf; ComponentLink2Description: JLCPCB Part URL; ComponentLink2URL: https://jlcpcb.com/partdetail/C424825; ComponentLink3Description: LCSC Part URL; ComponentLink3URL: https://lcsc.com/product-detail/Multilayer-Ceramic-Capacitors-MLCC---SMD-SMT_Walsin-Tech-Corp-Walsin-Tech-Corp-0402N100J250CT_C424825.html
footprint CAP-0402 (0402 (1005M) Capacitor)
pins: 1, 2

## 0402N100J500CT
designator C?  Capacitance: 10pF  (hidden comment: *)
Capacitor, Ceramic (MLCC), 10pF, ±5%, 50V, NP0, ±5%, SMD 0402; Manufacturer: Walsin Tech Corp; Manufacturer Part Number: 0402N100J500CT; Package Size: 0402; JLCPCB Basic Part: No; JLCPCB Part Number: C301961; Supplier 1: LCSC; Category: Capacitors - MLCC; Supplier Part Number 1: C301961; Tolerance: ±5%; Voltage Rating: 50V; Temperature Coefficient: NP0; RoHS: Yes; ComponentLink1Description: Datasheet; ComponentLink1URL: https://wmsc.lcsc.com/wmsc/upload/file/pdf/v2/lcsc/2304140030_Walsin-Tech-Corp-0402N100J500CT_C301961.pdf; ComponentLink2Description: JLCPCB Part URL; ComponentLink2URL: https://jlcpcb.com/partdetail/C301961; ComponentLink3Description: LCSC Part URL; ComponentLink3URL: https://lcsc.com/product-detail/Multilayer-Ceramic-Capacitors-MLCC---SMD-SMT_Walsin-Tech-Corp-Walsin-Tech-Corp-0402N100J500CT_C301961.html
footprint CAP-0402 (0402 (1005M) Capacitor)
pins: 1, 2

## 0402N100K500CT
designator C?  Capacitance: 10pF  (hidden comment: *)
Capacitor, Ceramic (MLCC), 10pF, ±10%, 50V, NP0, ±10%, SMD 0402; Manufacturer: Walsin Tech Corp; Manufacturer Part Number: 0402N100K500CT; Package Size: 0402; JLCPCB Basic Part: No; JLCPCB Part Number: C295954; Supplier 1: LCSC; Category: Capacitors - MLCC; Supplier Part Number 1: C295954; Tolerance: ±10%; Voltage Rating: 50V; Temperature Coefficient: NP0; RoHS: Yes; ComponentLink1Description: Datasheet; ComponentLink1URL: https://wmsc.lcsc.com/wmsc/upload/file/pdf/v2/lcsc/2304140030_Walsin-Tech-Corp-0402N100K500CT_C295954.pdf; ComponentLink2Description: JLCPCB Part URL; ComponentLink2URL: https://jlcpcb.com/partdetail/C295954; ComponentLink3Description: LCSC Part URL; ComponentLink3URL: https://lcsc.com/product-detail/Multilayer-Ceramic-Capacitors-MLCC---SMD-SMT_Walsin-Tech-Corp-Walsin-Tech-Corp-0402N100K500CT_C295954.html
footprint CAP-0402 (0402 (1005M) Capacitor)
pins: 1, 2

## 0402N101F500CT
designator C?  Capacitance: 100pF  (hidden comment: *)
Capacitor, Ceramic (MLCC), 100pF, ±1%, 50V, NP0, ±1%, SMD 0402; Manufacturer: Walsin Tech Corp; Manufacturer Part Number: 0402N101F500CT; Package Size: 0402; JLCPCB Basic Part: No; JLCPCB Part Number: C295955; Supplier 1: LCSC; Category: Capacitors - MLCC; Supplier Part Number 1: C295955; Tolerance: ±1%; Voltage Rating: 50V; Temperature Coefficient: NP0; RoHS: Yes; ComponentLink1Description: Datasheet; ComponentLink1URL: https://wmsc.lcsc.com/wmsc/upload/file/pdf/v2/lcsc/2304140030_Walsin-Tech-Corp-0402N101F500CT_C295955.pdf; ComponentLink2Description: JLCPCB Part URL; ComponentLink2URL: https://jlcpcb.com/partdetail/C295955; ComponentLink3Description: LCSC Part URL; ComponentLink3URL: https://lcsc.com/product-detail/Multilayer-Ceramic-Capacitors-MLCC---SMD-SMT_Walsin-Tech-Corp-Walsin-Tech-Corp-0402N101F500CT_C295955.html
footprint CAP-0402 (0402 (1005M) Capacitor)
pins: 1, 2

## 0402N101G500CT
designator C?  Capacitance: 100pF  (hidden comment: *)
Capacitor, Ceramic (MLCC), 100pF, ±2%, 50V, NP0, ±2%, SMD 0402; Manufacturer: Walsin Tech Corp; Manufacturer Part Number: 0402N101G500CT; Package Size: 0402; JLCPCB Basic Part: No; JLCPCB Part Number: C387967; Supplier 1: LCSC; Category: Capacitors - MLCC; Supplier Part Number 1: C387967; Tolerance: ±2%; Voltage Rating: 50V; Temperature Coefficient: NP0; RoHS: Yes; ComponentLink1Description: Datasheet; ComponentLink1URL: https://wmsc.lcsc.com/wmsc/upload/file/pdf/v2/lcsc/2304140030_Walsin-Tech-Corp-0402N101G500CT_C387967.pdf; ComponentLink2Description: JLCPCB Part URL; ComponentLink2URL: https://jlcpcb.com/partdetail/C387967; ComponentLink3Description: LCSC Part URL; ComponentLink3URL: https://lcsc.com/product-detail/Multilayer-Ceramic-Capacitors-MLCC---SMD-SMT_Walsin-Tech-Corp-Walsin-Tech-Corp-0402N101G500CT_C387967.html
footprint CAP-0402 (0402 (1005M) Capacitor)
pins: 1, 2

## 0402N101J250CT
designator C?  Capacitance: 100pF  (hidden comment: *)
Capacitor, Ceramic (MLCC), 100pF, ±5%, 25V, NP0, ±5%, SMD 0402; Manufacturer: Walsin Tech Corp; Manufacturer Part Number: 0402N101J250CT; Package Size: 0402; JLCPCB Basic Part: No; JLCPCB Part Number: C387968; Supplier 1: LCSC; Category: Capacitors - MLCC; Supplier Part Number 1: C387968; Tolerance: ±5%; Voltage Rating: 25V; Temperature Coefficient: NP0; RoHS: Yes; ComponentLink1Description: Datasheet; ComponentLink1URL: https://wmsc.lcsc.com/wmsc/upload/file/pdf/v2/lcsc/2304140030_Walsin-Tech-Corp-0402N101J250CT_C387968.pdf; ComponentLink2Description: JLCPCB Part URL; ComponentLink2URL: https://jlcpcb.com/partdetail/C387968; ComponentLink3Description: LCSC Part URL; ComponentLink3URL: https://lcsc.com/product-detail/Multilayer-Ceramic-Capacitors-MLCC---SMD-SMT_Walsin-Tech-Corp-Walsin-Tech-Corp-0402N101J250CT_C387968.html
footprint CAP-0402 (0402 (1005M) Capacitor)
pins: 1, 2

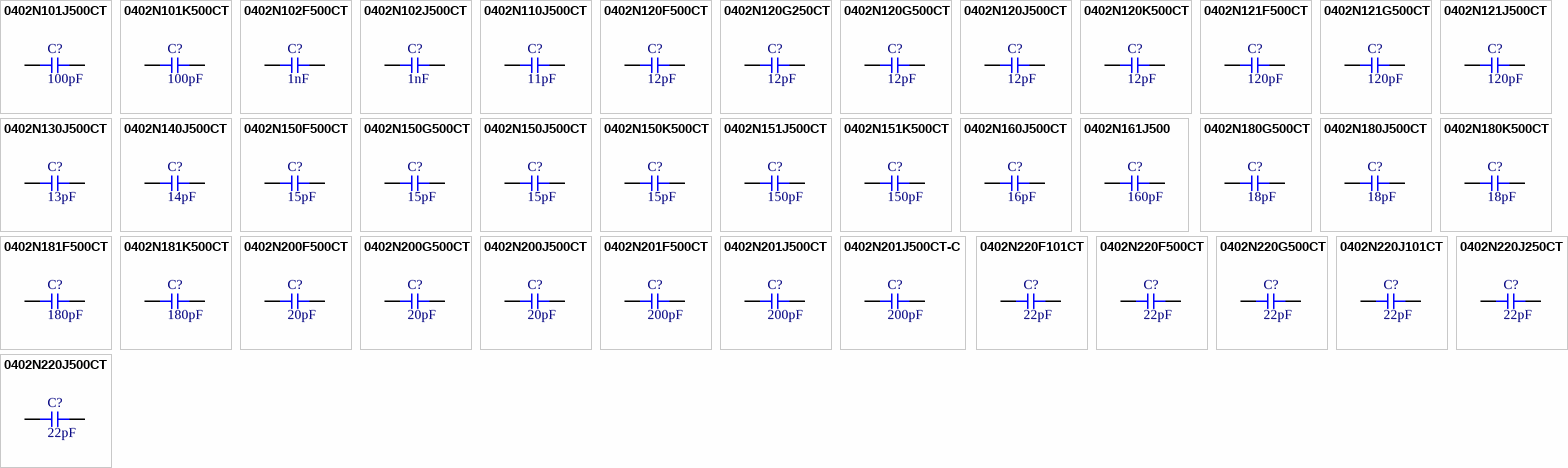
[diagram p11: symbols 0402N101J500CT to 0402N220J500CT]

## 0402N101J500CT
designator C?  Capacitance: 100pF  (hidden comment: *)
Capacitor, Ceramic (MLCC), 100pF, ±5%, 50V, NP0, ±5%, SMD 0402; Manufacturer: Walsin Tech Corp; Manufacturer Part Number: 0402N101J500CT; Package Size: 0402; JLCPCB Basic Part: No; JLCPCB Part Number: C301962; Supplier 1: LCSC; Category: Capacitors - MLCC; Supplier Part Number 1: C301962; Tolerance: ±5%; Voltage Rating: 50V; Temperature Coefficient: NP0; RoHS: Yes; ComponentLink1Description: Datasheet; ComponentLink1URL: https://wmsc.lcsc.com/wmsc/upload/file/pdf/v2/lcsc/2304140030_Walsin-Tech-Corp-0402N101J500CT_C301962.pdf; ComponentLink2Description: JLCPCB Part URL; ComponentLink2URL: https://jlcpcb.com/partdetail/C301962; ComponentLink3Description: LCSC Part URL; ComponentLink3URL: https://lcsc.com/product-detail/Multilayer-Ceramic-Capacitors-MLCC---SMD-SMT_Walsin-Tech-Corp-Walsin-Tech-Corp-0402N101J500CT_C301962.html
footprint CAP-0402 (0402 (1005M) Capacitor)
pins: 1, 2

## 0402N101K500CT
designator C?  Capacitance: 100pF  (hidden comment: *)
Capacitor, Ceramic (MLCC), 100pF, ±10%, 50V, NP0, ±10%, SMD 0402; Manufacturer: Walsin Tech Corp; Manufacturer Part Number: 0402N101K500CT; Package Size: 0402; JLCPCB Basic Part: No; JLCPCB Part Number: C295957; Supplier 1: LCSC; Category: Capacitors - MLCC; Supplier Part Number 1: C295957; Tolerance: ±10%; Voltage Rating: 50V; Temperature Coefficient: NP0; RoHS: Yes; ComponentLink1Description: Datasheet; ComponentLink1URL: https://wmsc.lcsc.com/wmsc/upload/file/pdf/v2/lcsc/2304140030_Walsin-Tech-Corp-0402N101K500CT_C295957.pdf; ComponentLink2Description: JLCPCB Part URL; ComponentLink2URL: https://jlcpcb.com/partdetail/C295957; ComponentLink3Description: LCSC Part URL; ComponentLink3URL: https://lcsc.com/product-detail/Multilayer-Ceramic-Capacitors-MLCC---SMD-SMT_Walsin-Tech-Corp-Walsin-Tech-Corp-0402N101K500CT_C295957.html
footprint CAP-0402 (0402 (1005M) Capacitor)
pins: 1, 2

## 0402N102F500CT
designator C?  Capacitance: 1nF  (hidden comment: *)
Capacitor, Ceramic (MLCC), 1nF, ±1%, 50V, C0G, ±1%, SMD 0402; Manufacturer: Walsin Tech Corp; Manufacturer Part Number: 0402N102F500CT; Package Size: 0402; JLCPCB Basic Part: No; JLCPCB Part Number: C3834952; Supplier 1: LCSC; Category: Capacitors - MLCC; Supplier Part Number 1: C3834952; Tolerance: ±1%; Voltage Rating: 50V; Temperature Coefficient: C0G; RoHS: Yes; ComponentLink1Description: Datasheet; ComponentLink1URL: https://wmsc.lcsc.com/wmsc/upload/file/pdf/v2/lcsc/2309201533_Walsin-Tech-Corp-0402N102F500CT_C3834952.pdf; ComponentLink2Description: JLCPCB Part URL; ComponentLink2URL: https://jlcpcb.com/partdetail/C3834952; ComponentLink3Description: LCSC Part URL; ComponentLink3URL: https://lcsc.com/product-detail/Multilayer-Ceramic-Capacitors-MLCC---SMD-SMT_Walsin-Tech-Corp-Walsin-Tech-Corp-0402N102F500CT_C3834952.html
footprint CAP-0402 (0402 (1005M) Capacitor)
pins: 1, 2

## 0402N102J500CT
designator C?  Capacitance: 1nF  (hidden comment: *)
Capacitor, Ceramic (MLCC), 1nF, ±5%, 50V, NP0, ±5%, SMD 0402; Manufacturer: Walsin Tech Corp; Manufacturer Part Number: 0402N102J500CT; Package Size: 0402; JLCPCB Basic Part: No; JLCPCB Part Number: C237166; Supplier 1: LCSC; Category: Capacitors - MLCC; Supplier Part Number 1: C237166; Tolerance: ±5%; Voltage Rating: 50V; Temperature Coefficient: NP0; RoHS: Yes; ComponentLink1Description: Datasheet; ComponentLink1URL: https://wmsc.lcsc.com/wmsc/upload/file/pdf/v2/lcsc/2304140030_Walsin-Tech-Corp-0402N102J500CT_C237166.pdf; ComponentLink2Description: JLCPCB Part URL; ComponentLink2URL: https://jlcpcb.com/partdetail/C237166; ComponentLink3Description: LCSC Part URL; ComponentLink3URL: https://lcsc.com/product-detail/Multilayer-Ceramic-Capacitors-MLCC---SMD-SMT_Walsin-Tech-Corp-Walsin-Tech-Corp-0402N102J500CT_C237166.html
footprint CAP-0402 (0402 (1005M) Capacitor)
pins: 1, 2

## 0402N110J500CT
designator C?  Capacitance: 11pF  (hidden comment: *)
Capacitor, Ceramic (MLCC), 11pF, ±5%, 50V, NP0, ±5%, SMD 0402; Manufacturer: Walsin Tech Corp; Manufacturer Part Number: 0402N110J500CT; Package Size: 0402; JLCPCB Basic Part: No; JLCPCB Part Number: C458855; Supplier 1: LCSC; Category: Capacitors - MLCC; Supplier Part Number 1: C458855; Tolerance: ±5%; Voltage Rating: 50V; Temperature Coefficient: NP0; RoHS: Yes; ComponentLink1Description: Datasheet; ComponentLink1URL: https://wmsc.lcsc.com/wmsc/upload/file/pdf/v2/lcsc/2304140030_Walsin-Tech-Corp-0402N110J500CT_C458855.pdf; ComponentLink2Description: JLCPCB Part URL; ComponentLink2URL: https://jlcpcb.com/partdetail/C458855; ComponentLink3Description: LCSC Part URL; ComponentLink3URL: https://lcsc.com/product-detail/Multilayer-Ceramic-Capacitors-MLCC---SMD-SMT_Walsin-Tech-Corp-Walsin-Tech-Corp-0402N110J500CT_C458855.html
footprint CAP-0402 (0402 (1005M) Capacitor)
pins: 1, 2

## 0402N120F500CT
designator C?  Capacitance: 12pF  (hidden comment: *)
Capacitor, Ceramic (MLCC), 12pF, ±1%, 50V, NP0, ±1%, SMD 0402; Manufacturer: Walsin Tech Corp; Manufacturer Part Number: 0402N120F500CT; Package Size: 0402; JLCPCB Basic Part: No; JLCPCB Part Number: C555399; Supplier 1: LCSC; Category: Capacitors - MLCC; Supplier Part Number 1: C555399; Tolerance: ±1%; Voltage Rating: 50V; Temperature Coefficient: NP0; RoHS: Yes; ComponentLink1Description: Datasheet; ComponentLink1URL: https://wmsc.lcsc.com/wmsc/upload/file/pdf/v2/lcsc/2304140030_Walsin-Tech-Corp-0402N120F500CT_C555399.pdf; ComponentLink2Description: JLCPCB Part URL; ComponentLink2URL: https://jlcpcb.com/partdetail/C555399; ComponentLink3Description: LCSC Part URL; ComponentLink3URL: https://lcsc.com/product-detail/Multilayer-Ceramic-Capacitors-MLCC---SMD-SMT_Walsin-Tech-Corp-Walsin-Tech-Corp-0402N120F500CT_C555399.html
footprint CAP-0402 (0402 (1005M) Capacitor)
pins: 1, 2

## 0402N120G250CT
designator C?  Capacitance: 12pF  (hidden comment: *)
Capacitor, Ceramic (MLCC), 12pF, ±2%, 25V, NP0, ±2%, SMD 0402; Manufacturer: Walsin Tech Corp; Manufacturer Part Number: 0402N120G250CT; Package Size: 0402; JLCPCB Basic Part: No; JLCPCB Part Number: C458856; Supplier 1: LCSC; Category: Capacitors - MLCC; Supplier Part Number 1: C458856; Tolerance: ±2%; Voltage Rating: 25V; Temperature Coefficient: NP0; RoHS: Yes; ComponentLink1Description: Datasheet; ComponentLink1URL: https://wmsc.lcsc.com/wmsc/upload/file/pdf/v2/lcsc/2304140030_Walsin-Tech-Corp-0402N120G250CT_C458856.pdf; ComponentLink2Description: JLCPCB Part URL; ComponentLink2URL: https://jlcpcb.com/partdetail/C458856; ComponentLink3Description: LCSC Part URL; ComponentLink3URL: https://lcsc.com/product-detail/Multilayer-Ceramic-Capacitors-MLCC---SMD-SMT_Walsin-Tech-Corp-Walsin-Tech-Corp-0402N120G250CT_C458856.html
footprint CAP-0402 (0402 (1005M) Capacitor)
pins: 1, 2
